# Altium schematic symbol library Analog Devices Data Converters Digital-to-Analog Converters.SchLib: 2231 symbols (part 4 of 135) (continued)
## AD664JPZ
designator U?
Quad 12-Bit Monolithic Digital-to-Analog Converter, 0 to +70 degC, P-44A, Pb-Free, Tube; Generic Part Number: AD664; Manufacturer: Analog Devices; PartNumber: AD664JPZ; # DAC Outputs: 4; Max V+: 16.5V; Op Pwr Diss: 525mW; Resolution (Bits): 12; Settling Time: 8µs; Single Supply: No; DatasheetVersion: Rev.D; PackageVersion: 2003; PackageReference: P-44A; PackageDescription: 44-Lead Plastic Leaded Chip Carrier [PLCC]; Supplier 1: Digi-Key; Supplier Part Number 1: AD664JPZ-ND; Supplier 2: Mouser; Supplier Part Number 2: 584-AD664JPZ; Packing: Tube; RoHS: Y; Mounting Technology: Surface Mount; Code_JEDEC: MO-047-AC; Code_IPC: PLCC-44; ComponentLink1Description: Manufacturer URL; ComponentLink1URL: http://www.analog.com/en/index.html; ComponentLink2Description: Datasheet; ComponentLink2URL: http://www.analog.com/static/imported-files/data_sheets/AD664.pdf; ComponentLink3Description: Package Specification; ComponentLink3URL: http://www.analog.com/static/imported-files/packages/533756178731793364534243243792136664964P44A.pdf; ComponentLink4Description: Product URL; ComponentLink4URL: http://www.analog.com/en/digital-to-analog-converters/da-converters/ad664/products/product.html
footprint P-44A_N (Leaded Chip Carrier, 44-Leads, Body 16.6x16.6mm, Pitch 1.27mm, IPC Medium Density)
footprint P-44A_L (Leaded Chip Carrier, 44-Leads, Body 16.6x16.6mm, Pitch 1.27mm, IPC High Density)
footprint P-44A_M (Leaded Chip Carrier, 44-Leads, Body 16.6x16.6mm, Pitch 1.27mm, IPC Low Density)
pins: 1 ~{RD} (in), 2 ~{LS} (in), 3 NO CONNECT, 4 AGND (power), 5 VCC (+12V/+15V) (power), 6 VEE (-12V/-15V) (power), 7 RFA (in), 8 VOA (hiz), 9 VOB (hiz), 10 RFB (in), 11 VREFIN (in), 12 RFC (in), 13 VOC (hiz), 14 VOD (hiz), 15 RFD (in), 16 NO CONNECT, 17 NO CONNECT, 18 ~{CS} (in), 19 DS0 (in), 20 DS1 (in), 21 DGND (power), 22 ~{RST} (in), 23 ~{QS0} (in), 24 ~{QS1} (in), 25 ~{QS2} (in), 26 ~{TR} (in), 27 ~{MS} (in), 28 (LSB) DB0 (io), 29 DB1 (io), 30 DB2 (io), 31 DB3 (io), 32 DB4 (io), 33 DB5 (io), 34 NO CONNECT, 35 DB6 (io), 36 DB7 (io), 37 DB8 (io), 38 DB9 (io), 39 DB10 (io), 40 DB11 (MSB) (io), 41 NO CONNECT, 42 VLL (+5V) (power), 43 NO CONNECT, 44 NO CONNECT

## AD664KN-BIP
designator U?
Quad 12-Bit Monolithic Digital-to-Analog Converter, 0 to +70 degC, N-28-2, Tube; Generic Part Number: AD664; Manufacturer: Analog Devices; PartNumber: AD664KN-BIP; # DAC Outputs: 4; Max V+: 16.5V; Op Pwr Diss: 525mW; Resolution (Bits): 12; Settling Time: 8µs; Single Supply: No; DatasheetVersion: Rev.D; PackageVersion: 071006-A; PackageReference: N-28-2; PackageDescription: 28-Lead Plastic Dual In-Line Package [PDIP]; Supplier 1: Digi-Key; Supplier Part Number 1: AD664KN-BIP-ND; Supplier 2: Newark; Supplier Part Number 2: 92F8922; Supplier 3: Mouser; Supplier Part Number 3: 584-AD664KN-BIP; Packing: Tube; RoHS: N; Mounting Technology: Through Hole; Code_JEDEC: MS-011; ComponentLink1Description: Manufacturer URL; ComponentLink1URL: http://www.analog.com/en/index.html; ComponentLink2Description: Datasheet; ComponentLink2URL: http://www.analog.com/static/imported-files/data_sheets/AD664.pdf; ComponentLink3Description: Package Specification; ComponentLink3URL: http://www.analog.com/static/imported-files/packages/50849324123784N_28_2.pdf; ComponentLink4Description: Product URL; ComponentLink4URL: http://www.analog.com/en/digital-to-analog-converters/da-converters/ad664/products/product.html
footprint N-28-2 (DIP, 28-Leads, Row Spacing 15.55mm, Pitch 2.54mm, Body 37.4x13.5mm)
pins: 1 VREF IN (in), 2 VOC (hiz), 3 VOD (hiz), 4 ~{CS} (in), 5 DS0 (in), 6 DS1 (in), 7 DGND (power), 8 ~{RST} (in), 9 DB0 (LSB) (io), 10 DB1 (io), 11 DB2 (io), 12 DB3 (io), 13 DB4 (io), 14 DB5 (io), 15 DB6 (io), 16 DB7 (io), 17 DB8 (io), 18 DB9 (io), 19 DB10 (io), 20 DB11 (MSB) (io), 21 VLL (+5V) (power), 22 ~{RD} (in), 23 ~{LS} (in), 24 AGND (power), 25 VCC (+12V/+15V) (power), 26 VEE (-12V/-15V) (power), 27 VOA (hiz), 28 VOB (hiz)

## AD664KNZ-BIP
designator U?
Quad 12-Bit Monolithic Digital-to-Analog Converter, 0 to +70 degC, N-28-2, Pb-Free, Tube; Generic Part Number: AD664; Manufacturer: Analog Devices; PartNumber: AD664KNZ-BIP; # DAC Outputs: 4; Max V+: 16.5V; Op Pwr Diss: 525mW; Resolution (Bits): 12; Settling Time: 8µs; Single Supply: No; DatasheetVersion: Rev.D; PackageVersion: 071006-A; PackageReference: N-28-2; PackageDescription: 28-Lead Plastic Dual In-Line Package [PDIP]; Supplier 1: Digi-Key; Supplier Part Number 1: AD664KNZ-BIP-ND; Supplier 2: Mouser; Supplier Part Number 2: 584-AD664KNZ-BIP; Packing: Tube; RoHS: Y; Mounting Technology: Through Hole; Code_JEDEC: MS-011; ComponentLink1Description: Manufacturer URL; ComponentLink1URL: http://www.analog.com/en/index.html; ComponentLink2Description: Datasheet; ComponentLink2URL: http://www.analog.com/static/imported-files/data_sheets/AD664.pdf; ComponentLink3Description: Package Specification; ComponentLink3URL: http://www.analog.com/static/imported-files/packages/50849324123784N_28_2.pdf; ComponentLink4Description: Product URL; ComponentLink4URL: http://www.analog.com/en/digital-to-analog-converters/da-converters/ad664/products/product.html
footprint N-28-2 (DIP, 28-Leads, Row Spacing 15.55mm, Pitch 2.54mm, Body 37.4x13.5mm)
pins: 1 VREF IN (in), 2 VOC (hiz), 3 VOD (hiz), 4 ~{CS} (in), 5 DS0 (in), 6 DS1 (in), 7 DGND (power), 8 ~{RST} (in), 9 DB0 (LSB) (io), 10 DB1 (io), 11 DB2 (io), 12 DB3 (io), 13 DB4 (io), 14 DB5 (io), 15 DB6 (io), 16 DB7 (io), 17 DB8 (io), 18 DB9 (io), 19 DB10 (io), 20 DB11 (MSB) (io), 21 VLL (+5V) (power), 22 ~{RD} (in), 23 ~{LS} (in), 24 AGND (power), 25 VCC (+12V/+15V) (power), 26 VEE (-12V/-15V) (power), 27 VOA (hiz), 28 VOB (hiz)

## AD664KNZ-UNI
designator U?
Quad 12-Bit Monolithic Digital-to-Analog Converter, 0 to +70 degC, N-28-2, Pb-Free, Tube; Generic Part Number: AD664; Manufacturer: Analog Devices; PartNumber: AD664KNZ-UNI; # DAC Outputs: 4; Max V+: 16.5V; Op Pwr Diss: 525mW; Resolution (Bits): 12; Settling Time: 8µs; Single Supply: No; DatasheetVersion: Rev.D; PackageVersion: 071006-A; PackageReference: N-28-2; PackageDescription: 28-Lead Plastic Dual In-Line Package [PDIP]; Supplier 1: Digi-Key; Supplier Part Number 1: AD664KNZ-UNI-ND; Supplier 2: Mouser; Supplier Part Number 2: 584-AD664KNZ-UNI; Packing: Tube; RoHS: Y; Mounting Technology: Through Hole; Code_JEDEC: MS-011; ComponentLink1Description: Manufacturer URL; ComponentLink1URL: http://www.analog.com/en/index.html; ComponentLink2Description: Datasheet; ComponentLink2URL: http://www.analog.com/static/imported-files/data_sheets/AD664.pdf; ComponentLink3Description: Package Specification; ComponentLink3URL: http://www.analog.com/static/imported-files/packages/50849324123784N_28_2.pdf; ComponentLink4Description: Product URL; ComponentLink4URL: http://www.analog.com/en/digital-to-analog-converters/da-converters/ad664/products/product.html
footprint N-28-2 (DIP, 28-Leads, Row Spacing 15.55mm, Pitch 2.54mm, Body 37.4x13.5mm)
pins: 1 VREF IN (in), 2 VOC (hiz), 3 VOD (hiz), 4 ~{CS} (in), 5 DS0 (in), 6 DS1 (in), 7 DGND (power), 8 ~{RST} (in), 9 DB0 (LSB) (io), 10 DB1 (io), 11 DB2 (io), 12 DB3 (io), 13 DB4 (io), 14 DB5 (io), 15 DB6 (io), 16 DB7 (io), 17 DB8 (io), 18 DB9 (io), 19 DB10 (io), 20 DB11 (MSB) (io), 21 VLL (+5V) (power), 22 ~{RD} (in), 23 ~{LS} (in), 24 AGND (power), 25 VCC (+12V/+15V) (power), 26 VEE (-12V/-15V) (power), 27 VOA (hiz), 28 VOB (hiz)

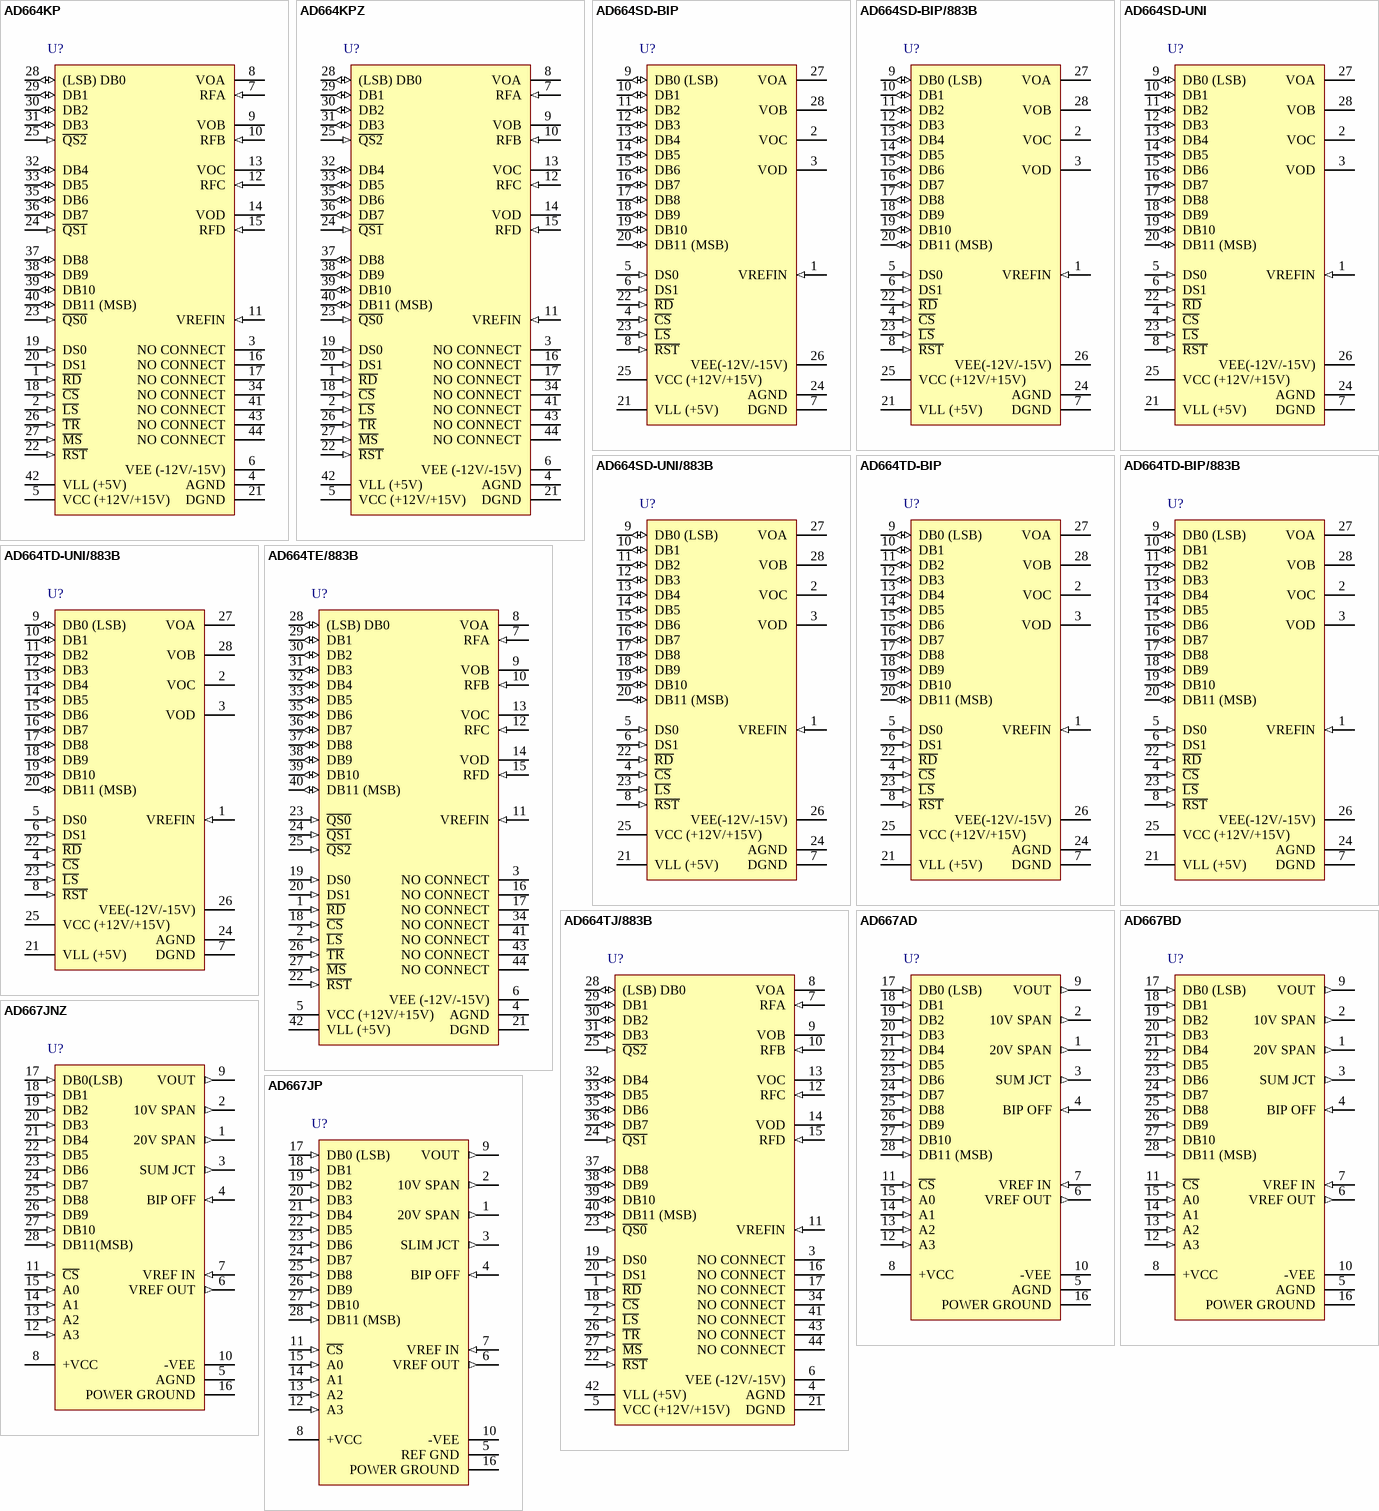
[diagram p5: symbols AD664KP to AD667JP]

## AD664KP
designator U?
Quad 12-Bit Monolithic Digital-to-Analog Converter, 0 to +70 degC, P-44A, Tube; Generic Part Number: AD664; Manufacturer: Analog Devices; PartNumber: AD664KP; # DAC Outputs: 4; Max V+: 16.5V; Op Pwr Diss: 525mW; Resolution (Bits): 12; Settling Time: 8µs; Single Supply: No; DatasheetVersion: Rev.D; PackageVersion: 2003; PackageReference: P-44A; PackageDescription: 44-Lead Plastic Leaded Chip Carrier [PLCC]; Supplier 1: Digi-Key; Supplier Part Number 1: AD664KP-ND; Supplier 2: Newark; Supplier Part Number 2: 05F7173; Supplier 3: Mouser; Supplier Part Number 3: 584-AD664KP; Packing: Tube; RoHS: N; Mounting Technology: Surface Mount; Code_JEDEC: MO-047-AC; Code_IPC: PLCC-44; ComponentLink1Description: Manufacturer URL; ComponentLink1URL: http://www.analog.com/en/index.html; ComponentLink2Description: Datasheet; ComponentLink2URL: http://www.analog.com/static/imported-files/data_sheets/AD664.pdf; ComponentLink3Description: Package Specification; ComponentLink3URL: http://www.analog.com/static/imported-files/packages/533756178731793364534243243792136664964P44A.pdf; ComponentLink4Description: Product URL; ComponentLink4URL: http://www.analog.com/en/digital-to-analog-converters/da-converters/ad664/products/product.html
footprint P-44A_N (Leaded Chip Carrier, 44-Leads, Body 16.6x16.6mm, Pitch 1.27mm, IPC Medium Density)
footprint P-44A_L (Leaded Chip Carrier, 44-Leads, Body 16.6x16.6mm, Pitch 1.27mm, IPC High Density)
footprint P-44A_M (Leaded Chip Carrier, 44-Leads, Body 16.6x16.6mm, Pitch 1.27mm, IPC Low Density)
pins: 1 ~{RD} (in), 2 ~{LS} (in), 3 NO CONNECT, 4 AGND (power), 5 VCC (+12V/+15V) (power), 6 VEE (-12V/-15V) (power), 7 RFA (in), 8 VOA (hiz), 9 VOB (hiz), 10 RFB (in), 11 VREFIN (in), 12 RFC (in), 13 VOC (hiz), 14 VOD (hiz), 15 RFD (in), 16 NO CONNECT, 17 NO CONNECT, 18 ~{CS} (in), 19 DS0 (in), 20 DS1 (in), 21 DGND (power), 22 ~{RST} (in), 23 ~{QS0} (in), 24 ~{QS1} (in), 25 ~{QS2} (in), 26 ~{TR} (in), 27 ~{MS} (in), 28 (LSB) DB0 (io), 29 DB1 (io), 30 DB2 (io), 31 DB3 (io), 32 DB4 (io), 33 DB5 (io), 34 NO CONNECT, 35 DB6 (io), 36 DB7 (io), 37 DB8 (io), 38 DB9 (io), 39 DB10 (io), 40 DB11 (MSB) (io), 41 NO CONNECT, 42 VLL (+5V) (power), 43 NO CONNECT, 44 NO CONNECT

## AD664KPZ
designator U?
Quad 12-Bit Monolithic Digital-to-Analog Converter, 0 to +70 degC, P-44A, Pb-Free, Tube; Generic Part Number: AD664; Manufacturer: Analog Devices; PartNumber: AD664KPZ; # DAC Outputs: 4; Max V+: 16.5V; Op Pwr Diss: 525mW; Resolution (Bits): 12; Settling Time: 8µs; Single Supply: No; DatasheetVersion: Rev.D; PackageVersion: 2003; PackageReference: P-44A; PackageDescription: 44-Lead Plastic Leaded Chip Carrier [PLCC]; Supplier 1: Digi-Key; Supplier Part Number 1: AD664KPZ-ND; Supplier 2: Mouser; Supplier Part Number 2: 584-AD664KPZ; Packing: Tube; RoHS: Y; Mounting Technology: Surface Mount; Code_JEDEC: MO-047-AC; Code_IPC: PLCC-44; ComponentLink1Description: Manufacturer URL; ComponentLink1URL: http://www.analog.com/en/index.html; ComponentLink2Description: Datasheet; ComponentLink2URL: http://www.analog.com/static/imported-files/data_sheets/AD664.pdf; ComponentLink3Description: Package Specification; ComponentLink3URL: http://www.analog.com/static/imported-files/packages/533756178731793364534243243792136664964P44A.pdf; ComponentLink4Description: Product URL; ComponentLink4URL: http://www.analog.com/en/digital-to-analog-converters/da-converters/ad664/products/product.html
footprint P-44A_N (Leaded Chip Carrier, 44-Leads, Body 16.6x16.6mm, Pitch 1.27mm, IPC Medium Density)
footprint P-44A_L (Leaded Chip Carrier, 44-Leads, Body 16.6x16.6mm, Pitch 1.27mm, IPC High Density)
footprint P-44A_M (Leaded Chip Carrier, 44-Leads, Body 16.6x16.6mm, Pitch 1.27mm, IPC Low Density)
pins: 1 ~{RD} (in), 2 ~{LS} (in), 3 NO CONNECT, 4 AGND (power), 5 VCC (+12V/+15V) (power), 6 VEE (-12V/-15V) (power), 7 RFA (in), 8 VOA (hiz), 9 VOB (hiz), 10 RFB (in), 11 VREFIN (in), 12 RFC (in), 13 VOC (hiz), 14 VOD (hiz), 15 RFD (in), 16 NO CONNECT, 17 NO CONNECT, 18 ~{CS} (in), 19 DS0 (in), 20 DS1 (in), 21 DGND (power), 22 ~{RST} (in), 23 ~{QS0} (in), 24 ~{QS1} (in), 25 ~{QS2} (in), 26 ~{TR} (in), 27 ~{MS} (in), 28 (LSB) DB0 (io), 29 DB1 (io), 30 DB2 (io), 31 DB3 (io), 32 DB4 (io), 33 DB5 (io), 34 NO CONNECT, 35 DB6 (io), 36 DB7 (io), 37 DB8 (io), 38 DB9 (io), 39 DB10 (io), 40 DB11 (MSB) (io), 41 NO CONNECT, 42 VLL (+5V) (power), 43 NO CONNECT, 44 NO CONNECT

## AD664SD-BIP
designator U?
Quad 12-Bit Monolithic Digital-to-Analog Converter, -55 to +125 degC, D-28-2, Tube; Generic Part Number: AD664; Manufacturer: Analog Devices; PartNumber: AD664SD-BIP; # DAC Outputs: 4; Max V+: 16.5V; Op Pwr Diss: 525mW; Resolution (Bits): 12; Settling Time: 8µs; Single Supply: No; DatasheetVersion: Rev.D; PackageVersion: Oct-2004; PackageReference: D-28-2; PackageDescription: 28-Lead Side-Brazed Ceramic Dual In-Line Package [SBDIP]; Supplier 1: Digi-Key; Supplier Part Number 1: AD664SD-BIP-ND; Supplier 2: Newark; Supplier Part Number 2: 16F3498; Supplier 3: Mouser; Supplier Part Number 3: 584-AD664SD-BIP; Packing: Tube; RoHS: N; Mounting Technology: Through Hole; ComponentLink1Description: Manufacturer URL; ComponentLink1URL: http://www.analog.com/en/index.html; ComponentLink2Description: Datasheet; ComponentLink2URL: http://www.analog.com/static/imported-files/data_sheets/AD664.pdf; ComponentLink3Description: Package Specification; ComponentLink3URL: http://www.analog.com/static/imported-files/packages/28824602D_28_2.pdf; ComponentLink4Description: Product URL; ComponentLink4URL: http://www.analog.com/en/digital-to-analog-converters/da-converters/ad664/products/product.html
footprint D-28-2 (DIP, 28-Leads, Row Spacing 15.24mm, Pitch 2.54mm, Body 37.2x14.1mm)
pins: 1 VREFIN (in), 2 VOC (hiz), 3 VOD (hiz), 4 ~{CS} (in), 5 DS0 (in), 6 DS1 (in), 7 DGND (power), 8 ~{RST} (in), 9 DB0 (LSB) (io), 10 DB1 (io), 11 DB2 (io), 12 DB3 (io), 13 DB4 (io), 14 DB5 (io), 15 DB6 (io), 16 DB7 (io), 17 DB8 (io), 18 DB9 (io), 19 DB10 (io), 20 DB11 (MSB) (io), 21 VLL (+5V) (power), 22 ~{RD} (in), 23 ~{LS} (in), 24 AGND (power), 25 VCC (+12V/+15V) (power), 26 VEE(-12V/-15V) (power), 27 VOA (hiz), 28 VOB (hiz)

## AD664SD-BIP/883B
designator U?
Quad 12-Bit Monolithic Digital-to-Analog Converter, -55 to +125 degC, D-28-2, Tube; Generic Part Number: AD664; Manufacturer: Analog Devices; PartNumber: AD664SD-BIP/883B; # DAC Outputs: 4; Max V+: 16.5V; Op Pwr Diss: 525mW; Resolution (Bits): 12; Settling Time: 8µs; Single Supply: No; DatasheetVersion: Rev.D; PackageVersion: Oct-2004; PackageReference: D-28-2; PackageDescription: 28-Lead Side-Brazed Ceramic Dual In-Line Package [SBDIP]; Supplier 1: Mouser; Supplier Part Number 1: 584-AD664SD-BIP883B; Packing: Tube; RoHS: N; Mounting Technology: Through Hole; ComponentLink1Description: Manufacturer URL; ComponentLink1URL: http://www.analog.com/en/index.html; ComponentLink2Description: Datasheet; ComponentLink2URL: http://www.analog.com/static/imported-files/data_sheets/AD664.pdf; ComponentLink3Description: Package Specification; ComponentLink3URL: http://www.analog.com/static/imported-files/packages/28824602D_28_2.pdf; ComponentLink4Description: Product URL; ComponentLink4URL: http://www.analog.com/en/digital-to-analog-converters/da-converters/ad664/products/product.html
footprint D-28-2 (DIP, 28-Leads, Row Spacing 15.24mm, Pitch 2.54mm, Body 37.2x14.1mm)
pins: 1 VREFIN (in), 2 VOC (hiz), 3 VOD (hiz), 4 ~{CS} (in), 5 DS0 (in), 6 DS1 (in), 7 DGND (power), 8 ~{RST} (in), 9 DB0 (LSB) (io), 10 DB1 (io), 11 DB2 (io), 12 DB3 (io), 13 DB4 (io), 14 DB5 (io), 15 DB6 (io), 16 DB7 (io), 17 DB8 (io), 18 DB9 (io), 19 DB10 (io), 20 DB11 (MSB) (io), 21 VLL (+5V) (power), 22 ~{RD} (in), 23 ~{LS} (in), 24 AGND (power), 25 VCC (+12V/+15V) (power), 26 VEE(-12V/-15V) (power), 27 VOA (hiz), 28 VOB (hiz)

## AD664SD-UNI
designator U?
Quad 12-Bit Monolithic Digital-to-Analog Converter, -55 to +125 degC, D-28-2, Tube; Generic Part Number: AD664; Manufacturer: Analog Devices; PartNumber: AD664SD-UNI; # DAC Outputs: 4; Max V+: 16.5V; Op Pwr Diss: 525mW; Resolution (Bits): 12; Settling Time: 8µs; Single Supply: No; DatasheetVersion: Rev.D; PackageVersion: Oct-2004; PackageReference: D-28-2; PackageDescription: 28-Lead Side-Brazed Ceramic Dual In-Line Package [SBDIP]; Supplier 1: Digi-Key; Supplier Part Number 1: AD664SD-UNI-ND; Supplier 2: Mouser; Supplier Part Number 2: 584-AD664SD-UNI; Packing: Tube; RoHS: N; Mounting Technology: Through Hole; ComponentLink1Description: Manufacturer URL; ComponentLink1URL: http://www.analog.com/en/index.html; ComponentLink2Description: Datasheet; ComponentLink2URL: http://www.analog.com/static/imported-files/data_sheets/AD664.pdf; ComponentLink3Description: Package Specification; ComponentLink3URL: http://www.analog.com/static/imported-files/packages/28824602D_28_2.pdf; ComponentLink4Description: Product URL; ComponentLink4URL: http://www.analog.com/en/digital-to-analog-converters/da-converters/ad664/products/product.html
footprint D-28-2 (DIP, 28-Leads, Row Spacing 15.24mm, Pitch 2.54mm, Body 37.2x14.1mm)
pins: 1 VREFIN (in), 2 VOC (hiz), 3 VOD (hiz), 4 ~{CS} (in), 5 DS0 (in), 6 DS1 (in), 7 DGND (power), 8 ~{RST} (in), 9 DB0 (LSB) (io), 10 DB1 (io), 11 DB2 (io), 12 DB3 (io), 13 DB4 (io), 14 DB5 (io), 15 DB6 (io), 16 DB7 (io), 17 DB8 (io), 18 DB9 (io), 19 DB10 (io), 20 DB11 (MSB) (io), 21 VLL (+5V) (power), 22 ~{RD} (in), 23 ~{LS} (in), 24 AGND (power), 25 VCC (+12V/+15V) (power), 26 VEE(-12V/-15V) (power), 27 VOA (hiz), 28 VOB (hiz)

## AD664SD-UNI/883B
designator U?
Quad 12-Bit Monolithic Digital-to-Analog Converter, -55 to +125 degC, D-28-2, Tube; Generic Part Number: AD664; Manufacturer: Analog Devices; PartNumber: AD664SD-UNI/883B; # DAC Outputs: 4; Max V+: 16.5V; Op Pwr Diss: 525mW; Resolution (Bits): 12; Settling Time: 8µs; Single Supply: No; DatasheetVersion: Rev.D; PackageVersion: Oct-2004; PackageReference: D-28-2; PackageDescription: 28-Lead Side-Brazed Ceramic Dual In-Line Package [SBDIP]; Supplier 1: Mouser; Supplier Part Number 1: 584-AD664SD-UNI883B; Packing: Tube; RoHS: N; Mounting Technology: Through Hole; ComponentLink1Description: Manufacturer URL; ComponentLink1URL: http://www.analog.com/en/index.html; ComponentLink2Description: Datasheet; ComponentLink2URL: http://www.analog.com/static/imported-files/data_sheets/AD664.pdf; ComponentLink3Description: Package Specification; ComponentLink3URL: http://www.analog.com/static/imported-files/packages/28824602D_28_2.pdf; ComponentLink4Description: Product URL; ComponentLink4URL: http://www.analog.com/en/digital-to-analog-converters/da-converters/ad664/products/product.html
footprint D-28-2 (DIP, 28-Leads, Row Spacing 15.24mm, Pitch 2.54mm, Body 37.2x14.1mm)
pins: 1 VREFIN (in), 2 VOC (hiz), 3 VOD (hiz), 4 ~{CS} (in), 5 DS0 (in), 6 DS1 (in), 7 DGND (power), 8 ~{RST} (in), 9 DB0 (LSB) (io), 10 DB1 (io), 11 DB2 (io), 12 DB3 (io), 13 DB4 (io), 14 DB5 (io), 15 DB6 (io), 16 DB7 (io), 17 DB8 (io), 18 DB9 (io), 19 DB10 (io), 20 DB11 (MSB) (io), 21 VLL (+5V) (power), 22 ~{RD} (in), 23 ~{LS} (in), 24 AGND (power), 25 VCC (+12V/+15V) (power), 26 VEE(-12V/-15V) (power), 27 VOA (hiz), 28 VOB (hiz)

## AD664TD-BIP
designator U?
Quad 12-Bit Monolithic Digital-to-Analog Converter, -55 to +125 degC, D-28-2, Tube; Generic Part Number: AD664; Manufacturer: Analog Devices; PartNumber: AD664TD-BIP; # DAC Outputs: 4; Max V+: 16.5V; Op Pwr Diss: 525mW; Resolution (Bits): 12; Settling Time: 8µs; Single Supply: No; DatasheetVersion: Rev.D; PackageVersion: Oct-2004; PackageReference: D-28-2; PackageDescription: 28-Lead Side-Brazed Ceramic Dual In-Line Package [SBDIP]; Supplier 1: Digi-Key; Supplier Part Number 1: AD664TD-BIP-ND; Supplier 2: Mouser; Supplier Part Number 2: 584-AD664TD-BIP; Packing: Tube; RoHS: N; Mounting Technology: Through Hole; ComponentLink1Description: Manufacturer URL; ComponentLink1URL: http://www.analog.com/en/index.html; ComponentLink2Description: Datasheet; ComponentLink2URL: http://www.analog.com/static/imported-files/data_sheets/AD664.pdf; ComponentLink3Description: Package Specification; ComponentLink3URL: http://www.analog.com/static/imported-files/packages/28824602D_28_2.pdf; ComponentLink4Description: Product URL; ComponentLink4URL: http://www.analog.com/en/digital-to-analog-converters/da-converters/ad664/products/product.html
footprint D-28-2 (DIP, 28-Leads, Row Spacing 15.24mm, Pitch 2.54mm, Body 37.2x14.1mm)
pins: 1 VREFIN (in), 2 VOC (hiz), 3 VOD (hiz), 4 ~{CS} (in), 5 DS0 (in), 6 DS1 (in), 7 DGND (power), 8 ~{RST} (in), 9 DB0 (LSB) (io), 10 DB1 (io), 11 DB2 (io), 12 DB3 (io), 13 DB4 (io), 14 DB5 (io), 15 DB6 (io), 16 DB7 (io), 17 DB8 (io), 18 DB9 (io), 19 DB10 (io), 20 DB11 (MSB) (io), 21 VLL (+5V) (power), 22 ~{RD} (in), 23 ~{LS} (in), 24 AGND (power), 25 VCC (+12V/+15V) (power), 26 VEE(-12V/-15V) (power), 27 VOA (hiz), 28 VOB (hiz)

## AD664TD-BIP/883B
designator U?
Quad 12-Bit Monolithic Digital-to-Analog Converter, -55 to +125 degC, D-28-2, Tube; Generic Part Number: AD664; Manufacturer: Analog Devices; PartNumber: AD664TD-BIP/883B; # DAC Outputs: 4; Max V+: 16.5V; Op Pwr Diss: 525mW; Resolution (Bits): 12; Settling Time: 8µs; Single Supply: No; DatasheetVersion: Rev.D; PackageVersion: Oct-2004; PackageReference: D-28-2; PackageDescription: 28-Lead Side-Brazed Ceramic Dual In-Line Package [SBDIP]; Supplier 1: Mouser; Supplier Part Number 1: 584-AD664TD-BIP883B; Packing: Tube; RoHS: N; Mounting Technology: Through Hole; ComponentLink1Description: Manufacturer URL; ComponentLink1URL: http://www.analog.com/en/index.html; ComponentLink2Description: Datasheet; ComponentLink2URL: http://www.analog.com/static/imported-files/data_sheets/AD664.pdf; ComponentLink3Description: Package Specification; ComponentLink3URL: http://www.analog.com/static/imported-files/packages/28824602D_28_2.pdf; ComponentLink4Description: Product URL; ComponentLink4URL: http://www.analog.com/en/digital-to-analog-converters/da-converters/ad664/products/product.html
footprint D-28-2 (DIP, 28-Leads, Row Spacing 15.24mm, Pitch 2.54mm, Body 37.2x14.1mm)
pins: 1 VREFIN (in), 2 VOC (hiz), 3 VOD (hiz), 4 ~{CS} (in), 5 DS0 (in), 6 DS1 (in), 7 DGND (power), 8 ~{RST} (in), 9 DB0 (LSB) (io), 10 DB1 (io), 11 DB2 (io), 12 DB3 (io), 13 DB4 (io), 14 DB5 (io), 15 DB6 (io), 16 DB7 (io), 17 DB8 (io), 18 DB9 (io), 19 DB10 (io), 20 DB11 (MSB) (io), 21 VLL (+5V) (power), 22 ~{RD} (in), 23 ~{LS} (in), 24 AGND (power), 25 VCC (+12V/+15V) (power), 26 VEE(-12V/-15V) (power), 27 VOA (hiz), 28 VOB (hiz)

## AD664TD-UNI/883B
designator U?
Quad 12-Bit Monolithic Digital-to-Analog Converter, -55 to +125 degC, D-28-2, Tube; Generic Part Number: AD664; Manufacturer: Analog Devices; PartNumber: AD664TD-UNI/883B; # DAC Outputs: 4; Max V+: 16.5V; Op Pwr Diss: 525mW; Resolution (Bits): 12; Settling Time: 8µs; Single Supply: No; DatasheetVersion: Rev.D; PackageVersion: Oct-2004; PackageReference: D-28-2; PackageDescription: 28-Lead Side-Brazed Ceramic Dual In-Line Package [SBDIP]; Supplier 1: Mouser; Supplier Part Number 1: 584-AD664TD-UNI883B; Packing: Tube; RoHS: N; Mounting Technology: Through Hole; ComponentLink1Description: Manufacturer URL; ComponentLink1URL: http://www.analog.com/en/index.html; ComponentLink2Description: Datasheet; ComponentLink2URL: http://www.analog.com/static/imported-files/data_sheets/AD664.pdf; ComponentLink3Description: Package Specification; ComponentLink3URL: http://www.analog.com/static/imported-files/packages/28824602D_28_2.pdf; ComponentLink4Description: Product URL; ComponentLink4URL: http://www.analog.com/en/digital-to-analog-converters/da-converters/ad664/products/product.html
footprint D-28-2 (DIP, 28-Leads, Row Spacing 15.24mm, Pitch 2.54mm, Body 37.2x14.1mm)
pins: 1 VREFIN (in), 2 VOC (hiz), 3 VOD (hiz), 4 ~{CS} (in), 5 DS0 (in), 6 DS1 (in), 7 DGND (power), 8 ~{RST} (in), 9 DB0 (LSB) (io), 10 DB1 (io), 11 DB2 (io), 12 DB3 (io), 13 DB4 (io), 14 DB5 (io), 15 DB6 (io), 16 DB7 (io), 17 DB8 (io), 18 DB9 (io), 19 DB10 (io), 20 DB11 (MSB) (io), 21 VLL (+5V) (power), 22 ~{RD} (in), 23 ~{LS} (in), 24 AGND (power), 25 VCC (+12V/+15V) (power), 26 VEE(-12V/-15V) (power), 27 VOA (hiz), 28 VOB (hiz)
